# Altium footprint library Pcb-hionyPcbLib.PcbLib: 580 footprints (part 3 of 37)
Each footprint in its own frame and in the unit in brackets; x right, y up, seen from the top. Pads: shape width x height; smd on the part's side, far side on the other; paste and mask are expansions set on the pad; w line width, h text height; cw(c..) or ccw(c..) is an arc to the next point about the centre after c.
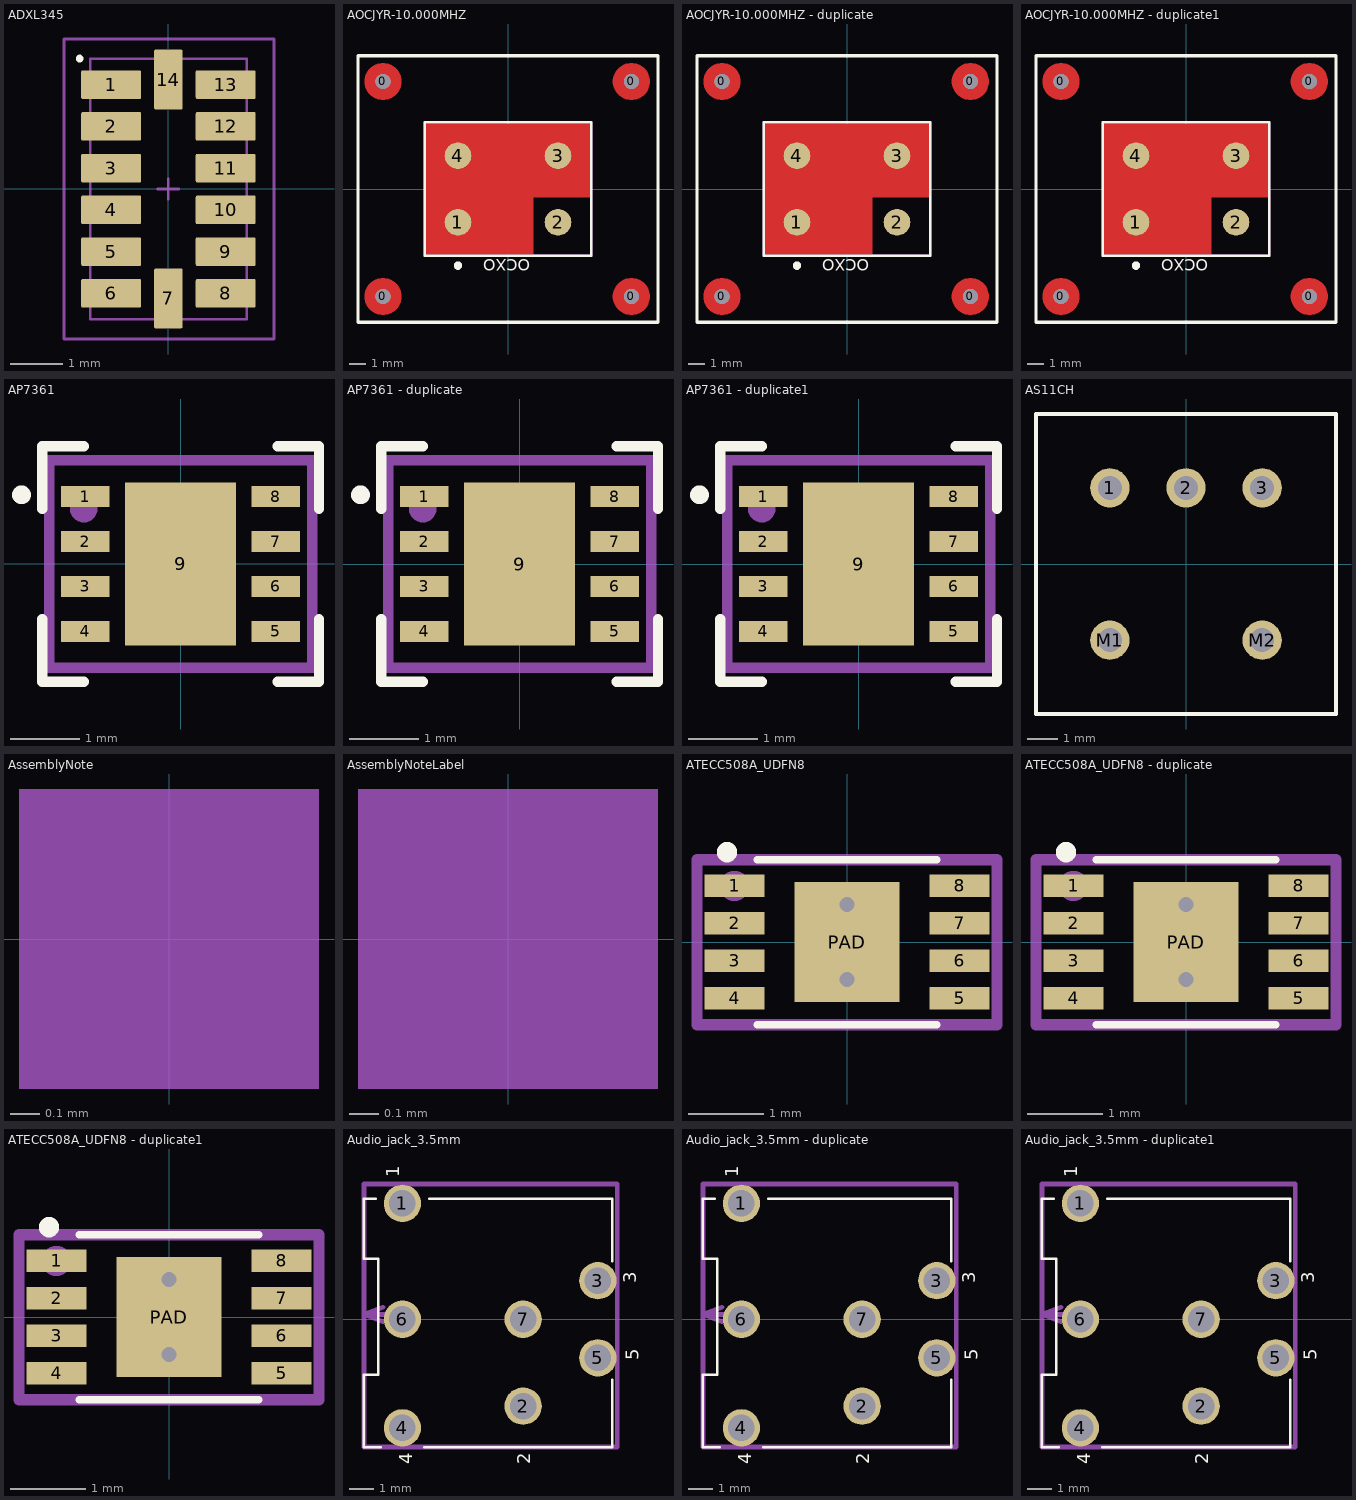
[diagram p2: the footprints below, top view; thin cyan lines are the x and y axes]

## ADXL345 [mm]
pads (14):
  rrect10% 1.145x0.55 smd mask+0.05: 1(-1.097,2) 2(-1.097,1.2) 3(-1.098,0.4) 4(-1.098,-0.4) 5(-1.097,-1.2) 6(-1.097,-2) 8(1.097,-2) 9(1.097,-1.2) 10(1.098,-0.4) 11(1.097,0.4) 12(1.098,1.2) 13(1.097,2)
  rrect10% 0.55x1.145 smd mask+0.05: 7(0,-2.098) 14(0,2.098)
Top Overlay:
  circle w0.127: c-1.7,2.5 r0.01
Mechanical 11:
  text ".Designator" at 0.292,-0.8 h0.5
Mechanical 13:
  lines w0.05: -1.5,-2.5 -1.5,2.5 1.5,2.5 1.5,-2.5 -1.5,-2.5
Mechanical 15:
  lines w0.05: -0.2,0 0.2,0 ; 0,-0.2 0,0.2 ; -2,-2.875 -2,2.875 2.025,2.875 2.025,-2.875 -2,-2.875
3D body "User Library-ADXL345.step": height 1.01, standoff 0.01, extent -1.5,-2.5 1.5,2.5

## AOCJYR-10.000MHZ [mm]
pads (8):
  round 0.9 hole 0.9 unplated: 0(-7.5,6.45) 0(-7.5,-6.45) 0(7.4,-6.45) 0(7.4,6.45)
  round 1.6 smd mask+0.05: 1(-3,-2) 2(3,-2) 3(3,2) 4(-3,2)
Top Layer:
  pour cut-out: 4.9,-0.5 4.9,3.9 -4.9,3.9 -4.9,-3.9 1.525,-3.9 1.525,-0.5
  pour cut-out: 7.4,6.45 7.4,7.55 7.508,7.55 7.721,7.508 7.921,7.425 8.101,7.304 8.254,7.151 8.375,6.971 8.458,6.771 8.5,6.558 8.5,6.45
  pour cut-out: 7.4,6.45 7.4,5.35 7.292,5.35 7.079,5.392 6.879,5.475 6.699,5.596 6.546,5.749 6.425,5.929 6.342,6.129 6.3,6.342 6.3,6.45
  pour cut-out: 7.4,6.45 6.3,6.45 6.3,6.558 6.342,6.771 6.425,6.971 6.546,7.151 6.699,7.304 6.879,7.425 7.079,7.508 7.292,7.55 7.4,7.55
  pour cut-out: 7.4,6.45 8.5,6.45 8.5,6.342 8.458,6.129 8.375,5.929 8.254,5.749 8.101,5.596 7.921,5.475 7.721,5.392 7.508,5.35 7.4,5.35
  pour cut-out: -7.5,6.45 -7.5,7.55 -7.392,7.55 -7.179,7.508 -6.979,7.425 -6.799,7.304 -6.646,7.151 -6.525,6.971 -6.442,6.771 -6.4,6.558 -6.4,6.45
  pour cut-out: -7.5,6.45 -7.5,5.35 -7.608,5.35 -7.821,5.392 -8.021,5.475 -8.201,5.596 -8.354,5.749 -8.475,5.929 -8.558,6.129 -8.6,6.342 -8.6,6.45
  pour cut-out: -7.5,6.45 -8.6,6.45 -8.6,6.558 -8.558,6.771 -8.475,6.971 -8.354,7.151 -8.201,7.304 -8.021,7.425 -7.821,7.508 -7.608,7.55 -7.5,7.55
  pour cut-out: -7.5,6.45 -6.4,6.45 -6.4,6.342 -6.442,6.129 -6.525,5.929 -6.646,5.749 -6.799,5.596 -6.979,5.475 -7.179,5.392 -7.392,5.35 -7.5,5.35
  pour cut-out: -7.5,-6.45 -7.5,-5.35 -7.392,-5.35 -7.179,-5.392 -6.979,-5.475 -6.799,-5.596 -6.646,-5.749 -6.525,-5.929 -6.442,-6.129 -6.4,-6.342 -6.4,-6.45
  pour cut-out: -7.5,-6.45 -7.5,-7.55 -7.608,-7.55 -7.821,-7.508 -8.021,-7.425 -8.201,-7.304 -8.354,-7.151 -8.475,-6.971 -8.558,-6.771 -8.6,-6.558 -8.6,-6.45
  pour cut-out: -7.5,-6.45 -8.6,-6.45 -8.6,-6.342 -8.558,-6.129 -8.475,-5.929 -8.354,-5.749 -8.201,-5.596 -8.021,-5.475 -7.821,-5.392 -7.608,-5.35 -7.5,-5.35
  pour cut-out: -7.5,-6.45 -6.4,-6.45 -6.4,-6.558 -6.442,-6.771 -6.525,-6.971 -6.646,-7.151 -6.799,-7.304 -6.979,-7.425 -7.179,-7.508 -7.392,-7.55 -7.5,-7.55
  pour cut-out: 7.4,-6.45 8.5,-6.45 8.5,-6.558 8.458,-6.771 8.375,-6.971 8.254,-7.151 8.101,-7.304 7.921,-7.425 7.721,-7.508 7.508,-7.55 7.4,-7.55
  pour cut-out: 7.4,-6.45 6.3,-6.45 6.3,-6.342 6.342,-6.129 6.425,-5.929 6.546,-5.749 6.699,-5.596 6.879,-5.475 7.079,-5.392 7.292,-5.35 7.4,-5.35
  pour cut-out: 7.4,-6.45 7.4,-7.55 7.292,-7.55 7.079,-7.508 6.879,-7.425 6.699,-7.304 6.546,-7.151 6.425,-6.971 6.342,-6.771 6.3,-6.558 6.3,-6.45
  pour cut-out: 7.4,-6.45 7.4,-5.35 7.508,-5.35 7.721,-5.392 7.921,-5.475 8.101,-5.596 8.254,-5.749 8.375,-5.929 8.458,-6.129 8.5,-6.342 8.5,-6.45
Top Overlay:
  circle w0.3: c-3,-4.6 r0.1
  lines w0.15: -5,-4 5,-4 5,4 -5,4 -5,-4
  lines w0.2: -9,-8 -9,8 9,8 9,-8 -9,-8
  text "OCXO" at 1.325,-4.225 h0.7
Top Solder:
  drawing of 16 lines, arcs and shapes, not listed
Mechanical 15:
  circle w0.3: c-3,-2 r0.141
  lines w0.15: -1.25,0 1.25,0 ; 0,-1.25 0,1.25 ; -5,-4 -5,4 5,4 5,-4 -5,-4
  text ".Designator" at 2.225,-0.575 h0.55
3D body: height 4.1, standoff 0, extent -4.85,-3.75 4.85,3.75
3D body: height 4.2, standoff 4.1, extent -3.492,-2.498 -2.496,-1.5
3D body: height 0.4, standoff 0, extent -4.9,-3 -4.75,3
3D body: height 0.4, standoff 0, extent 4.75,-3 4.9,3

## AOCJYR-10.000MHZ - duplicate [mm]
pads (8):
  round 0.9 hole 0.9 unplated: 0(-7.5,6.45) 0(-7.5,-6.45) 0(7.4,-6.45) 0(7.4,6.45)
  round 1.6 smd mask+0.05: 1(-3,-2) 2(3,-2) 3(3,2) 4(-3,2)
Top Layer:
  pour cut-out: 7.4,6.45 7.4,7.55 7.508,7.55 7.721,7.508 7.921,7.425 8.101,7.304 8.254,7.151 8.375,6.971 8.458,6.771 8.5,6.558 8.5,6.45
  pour cut-out: 7.4,6.45 7.4,5.35 7.292,5.35 7.079,5.392 6.879,5.475 6.699,5.596 6.546,5.749 6.425,5.929 6.342,6.129 6.3,6.342 6.3,6.45
  pour cut-out: 7.4,6.45 6.3,6.45 6.3,6.558 6.342,6.771 6.425,6.971 6.546,7.151 6.699,7.304 6.879,7.425 7.079,7.508 7.292,7.55 7.4,7.55
  pour cut-out: 7.4,6.45 8.5,6.45 8.5,6.342 8.458,6.129 8.375,5.929 8.254,5.749 8.101,5.596 7.921,5.475 7.721,5.392 7.508,5.35 7.4,5.35
  pour cut-out: -7.5,6.45 -7.5,7.55 -7.392,7.55 -7.179,7.508 -6.979,7.425 -6.799,7.304 -6.646,7.151 -6.525,6.971 -6.442,6.771 -6.4,6.558 -6.4,6.45
  pour cut-out: -7.5,6.45 -7.5,5.35 -7.608,5.35 -7.821,5.392 -8.021,5.475 -8.201,5.596 -8.354,5.749 -8.475,5.929 -8.558,6.129 -8.6,6.342 -8.6,6.45
  pour cut-out: -7.5,6.45 -8.6,6.45 -8.6,6.558 -8.558,6.771 -8.475,6.971 -8.354,7.151 -8.201,7.304 -8.021,7.425 -7.821,7.508 -7.608,7.55 -7.5,7.55
  pour cut-out: -7.5,6.45 -6.4,6.45 -6.4,6.342 -6.442,6.129 -6.525,5.929 -6.646,5.749 -6.799,5.596 -6.979,5.475 -7.179,5.392 -7.392,5.35 -7.5,5.35
  pour cut-out: -7.5,-6.45 -7.5,-5.35 -7.392,-5.35 -7.179,-5.392 -6.979,-5.475 -6.799,-5.596 -6.646,-5.749 -6.525,-5.929 -6.442,-6.129 -6.4,-6.342 -6.4,-6.45
  pour cut-out: -7.5,-6.45 -7.5,-7.55 -7.608,-7.55 -7.821,-7.508 -8.021,-7.425 -8.201,-7.304 -8.354,-7.151 -8.475,-6.971 -8.558,-6.771 -8.6,-6.558 -8.6,-6.45
  pour cut-out: -7.5,-6.45 -8.6,-6.45 -8.6,-6.342 -8.558,-6.129 -8.475,-5.929 -8.354,-5.749 -8.201,-5.596 -8.021,-5.475 -7.821,-5.392 -7.608,-5.35 -7.5,-5.35
  pour cut-out: -7.5,-6.45 -6.4,-6.45 -6.4,-6.558 -6.442,-6.771 -6.525,-6.971 -6.646,-7.151 -6.799,-7.304 -6.979,-7.425 -7.179,-7.508 -7.392,-7.55 -7.5,-7.55
  pour cut-out: 7.4,-6.45 8.5,-6.45 8.5,-6.558 8.458,-6.771 8.375,-6.971 8.254,-7.151 8.101,-7.304 7.921,-7.425 7.721,-7.508 7.508,-7.55 7.4,-7.55
  pour cut-out: 7.4,-6.45 6.3,-6.45 6.3,-6.342 6.342,-6.129 6.425,-5.929 6.546,-5.749 6.699,-5.596 6.879,-5.475 7.079,-5.392 7.292,-5.35 7.4,-5.35
  pour cut-out: 7.4,-6.45 7.4,-7.55 7.292,-7.55 7.079,-7.508 6.879,-7.425 6.699,-7.304 6.546,-7.151 6.425,-6.971 6.342,-6.771 6.3,-6.558 6.3,-6.45
  pour cut-out: 7.4,-6.45 7.4,-5.35 7.508,-5.35 7.721,-5.392 7.921,-5.475 8.101,-5.596 8.254,-5.749 8.375,-5.929 8.458,-6.129 8.5,-6.342 8.5,-6.45
  pour cut-out: 4.9,-0.5 4.9,3.9 -4.9,3.9 -4.9,-3.9 1.525,-3.9 1.525,-0.5
Top Overlay:
  circle w0.3: c-3,-4.6 r0.1
  lines w0.15: -5,-4 5,-4 5,4 -5,4 -5,-4
  lines w0.2: -9,-8 -9,8 9,8 9,-8 -9,-8
  text "OCXO" at 1.325,-4.225 h0.7
Top Solder:
  drawing of 16 lines, arcs and shapes, not listed
Mechanical 15:
  circle w0.3: c-3,-2 r0.141
  lines w0.15: -1.25,0 1.25,0 ; 0,-1.25 0,1.25 ; -5,-4 -5,4 5,4 5,-4 -5,-4
  text ".Designator" at 2.225,-0.575 h0.55
3D body: height 4.1, standoff 0, extent -4.85,-3.75 4.85,3.75
3D body: height 4.2, standoff 4.1, extent -3.492,-2.498 -2.496,-1.5
3D body: height 0.4, standoff 0, extent -4.9,-3 -4.75,3
3D body: height 0.4, standoff 0, extent 4.75,-3 4.9,3

## AOCJYR-10.000MHZ - duplicate1 [mm]
pads (8):
  round 0.9 hole 0.9 unplated: 0(-7.5,6.45) 0(-7.5,-6.45) 0(7.4,-6.45) 0(7.4,6.45)
  round 1.6 smd mask+0.05: 1(-3,-2) 2(3,-2) 3(3,2) 4(-3,2)
Top Layer:
  pour cut-out: 7.4,6.45 7.4,7.55 7.508,7.55 7.721,7.508 7.921,7.425 8.101,7.304 8.254,7.151 8.375,6.971 8.458,6.771 8.5,6.558 8.5,6.45
  pour cut-out: 7.4,6.45 7.4,5.35 7.292,5.35 7.079,5.392 6.879,5.475 6.699,5.596 6.546,5.749 6.425,5.929 6.342,6.129 6.3,6.342 6.3,6.45
  pour cut-out: 7.4,6.45 6.3,6.45 6.3,6.558 6.342,6.771 6.425,6.971 6.546,7.151 6.699,7.304 6.879,7.425 7.079,7.508 7.292,7.55 7.4,7.55
  pour cut-out: 7.4,6.45 8.5,6.45 8.5,6.342 8.458,6.129 8.375,5.929 8.254,5.749 8.101,5.596 7.921,5.475 7.721,5.392 7.508,5.35 7.4,5.35
  pour cut-out: -7.5,6.45 -7.5,7.55 -7.392,7.55 -7.179,7.508 -6.979,7.425 -6.799,7.304 -6.646,7.151 -6.525,6.971 -6.442,6.771 -6.4,6.558 -6.4,6.45
  pour cut-out: -7.5,6.45 -7.5,5.35 -7.608,5.35 -7.821,5.392 -8.021,5.475 -8.201,5.596 -8.354,5.749 -8.475,5.929 -8.558,6.129 -8.6,6.342 -8.6,6.45
  pour cut-out: -7.5,6.45 -8.6,6.45 -8.6,6.558 -8.558,6.771 -8.475,6.971 -8.354,7.151 -8.201,7.304 -8.021,7.425 -7.821,7.508 -7.608,7.55 -7.5,7.55
  pour cut-out: -7.5,6.45 -6.4,6.45 -6.4,6.342 -6.442,6.129 -6.525,5.929 -6.646,5.749 -6.799,5.596 -6.979,5.475 -7.179,5.392 -7.392,5.35 -7.5,5.35
  pour cut-out: -7.5,-6.45 -7.5,-5.35 -7.392,-5.35 -7.179,-5.392 -6.979,-5.475 -6.799,-5.596 -6.646,-5.749 -6.525,-5.929 -6.442,-6.129 -6.4,-6.342 -6.4,-6.45
  pour cut-out: -7.5,-6.45 -7.5,-7.55 -7.608,-7.55 -7.821,-7.508 -8.021,-7.425 -8.201,-7.304 -8.354,-7.151 -8.475,-6.971 -8.558,-6.771 -8.6,-6.558 -8.6,-6.45
  pour cut-out: -7.5,-6.45 -8.6,-6.45 -8.6,-6.342 -8.558,-6.129 -8.475,-5.929 -8.354,-5.749 -8.201,-5.596 -8.021,-5.475 -7.821,-5.392 -7.608,-5.35 -7.5,-5.35
  pour cut-out: -7.5,-6.45 -6.4,-6.45 -6.4,-6.558 -6.442,-6.771 -6.525,-6.971 -6.646,-7.151 -6.799,-7.304 -6.979,-7.425 -7.179,-7.508 -7.392,-7.55 -7.5,-7.55
  pour cut-out: 7.4,-6.45 8.5,-6.45 8.5,-6.558 8.458,-6.771 8.375,-6.971 8.254,-7.151 8.101,-7.304 7.921,-7.425 7.721,-7.508 7.508,-7.55 7.4,-7.55
  pour cut-out: 7.4,-6.45 6.3,-6.45 6.3,-6.342 6.342,-6.129 6.425,-5.929 6.546,-5.749 6.699,-5.596 6.879,-5.475 7.079,-5.392 7.292,-5.35 7.4,-5.35
  pour cut-out: 7.4,-6.45 7.4,-7.55 7.292,-7.55 7.079,-7.508 6.879,-7.425 6.699,-7.304 6.546,-7.151 6.425,-6.971 6.342,-6.771 6.3,-6.558 6.3,-6.45
  pour cut-out: 7.4,-6.45 7.4,-5.35 7.508,-5.35 7.721,-5.392 7.921,-5.475 8.101,-5.596 8.254,-5.749 8.375,-5.929 8.458,-6.129 8.5,-6.342 8.5,-6.45
  pour cut-out: 4.9,-0.5 4.9,3.9 -4.9,3.9 -4.9,-3.9 1.525,-3.9 1.525,-0.5
Top Overlay:
  circle w0.3: c-3,-4.6 r0.1
  lines w0.15: -5,-4 5,-4 5,4 -5,4 -5,-4
  lines w0.2: -9,-8 -9,8 9,8 9,-8 -9,-8
  text "OCXO" at 1.325,-4.225 h0.7
Top Solder:
  drawing of 16 lines, arcs and shapes, not listed
Mechanical 15:
  circle w0.3: c-3,-2 r0.141
  lines w0.15: -1.25,0 1.25,0 ; 0,-1.25 0,1.25 ; -5,-4 -5,4 5,4 5,-4 -5,-4
  text ".Designator" at 2.225,-0.575 h0.55
3D body: height 4.1, standoff 0, extent -4.85,-3.75 4.85,3.75
3D body: height 4.2, standoff 4.1, extent -3.492,-2.498 -2.496,-1.5
3D body: height 0.4, standoff 0, extent -4.9,-3 -4.75,3
3D body: height 0.4, standoff 0, extent 4.75,-3 4.9,3

## AP7361 [mm]
pads (9):
  rect 0.7x0.3 smd mask+0.05: 1(-1.375,0.975) 2(-1.375,0.325) 3(-1.375,-0.325) 4(-1.375,-0.975) 5(1.375,-0.975) 6(1.375,-0.325) 7(1.375,0.325) 8(1.375,0.975)
  rect 1.6x2.35 smd mask+0.05: 9(0,0)
Top Overlay:
  circle w0.2: c-2.3,1 r0.035
  lines w0.15: -2,-0.8 -2,-1.7 -1.4,-1.7 ; -2,0.8 -2,1.7 -1.4,1.7 ; 1.4,-1.7 2,-1.7 2,-0.8 ; 1.4,1.7 2,1.7 2,0.8
Mechanical 15:
  circle w0.2: c-1.4,0.8 r0.1
  lines w0.15: -0.4,0 0,0 ; 0,-0.4 0,0 ; 0,0.4 0,0 ; 0.4,0 0,0 ; -1.9,-1.5 1.9,-1.5 1.9,1.5 -1.9,1.5 -1.9,-1.5
  text ".Designator" at 0.93,1.214 h0.55
3D body "User Library-DFN8_3x3mm__65mm.step": height 0.8, standoff 0, extent -1.52,-1.5 1.5,1.5

## AP7361 - duplicate [mm]
pads (9):
  rect 0.7x0.3 smd mask+0.05: 1(-1.375,0.975) 2(-1.375,0.325) 3(-1.375,-0.325) 4(-1.375,-0.975) 5(1.375,-0.975) 6(1.375,-0.325) 7(1.375,0.325) 8(1.375,0.975)
  rect 1.6x2.35 smd mask+0.05: 9(0,0)
Top Overlay:
  circle w0.2: c-2.3,1 r0.035
  lines w0.15: -2,-0.8 -2,-1.7 -1.4,-1.7 ; -2,0.8 -2,1.7 -1.4,1.7 ; 1.4,-1.7 2,-1.7 2,-0.8 ; 1.4,1.7 2,1.7 2,0.8
Mechanical 15:
  circle w0.2: c-1.4,0.8 r0.1
  lines w0.15: -0.4,0 0,0 ; 0,-0.4 0,0 ; 0,0.4 0,0 ; 0.4,0 0,0 ; -1.9,-1.5 1.9,-1.5 1.9,1.5 -1.9,1.5 -1.9,-1.5
  text ".Designator" at 1.025,-1.907 h0.55
3D body "User Library-DFN8_3x3mm__65mm.step": height 0.8, standoff 0, extent -1.52,-1.5 1.5,1.5

## AP7361 - duplicate1 [mm]
pads (9):
  rect 0.7x0.3 smd mask+0.05: 1(-1.375,0.975) 2(-1.375,0.325) 3(-1.375,-0.325) 4(-1.375,-0.975) 5(1.375,-0.975) 6(1.375,-0.325) 7(1.375,0.325) 8(1.375,0.975)
  rect 1.6x2.35 smd mask+0.05: 9(0,0)
Top Overlay:
  circle w0.2: c-2.3,1 r0.035
  lines w0.15: -2,-0.8 -2,-1.7 -1.4,-1.7 ; -2,0.8 -2,1.7 -1.4,1.7 ; 1.4,-1.7 2,-1.7 2,-0.8 ; 1.4,1.7 2,1.7 2,0.8
Mechanical 15:
  circle w0.2: c-1.4,0.8 r0.1
  lines w0.15: -0.4,0 0,0 ; 0,-0.4 0,0 ; 0,0.4 0,0 ; 0.4,0 0,0 ; -1.9,-1.5 1.9,-1.5 1.9,1.5 -1.9,1.5 -1.9,-1.5
  text ".Designator" at 1.025,-1.907 h0.55
3D body "User Library-DFN8_3x3mm__65mm.step": height 0.8, standoff 0, extent -1.52,-1.5 1.5,1.5

## AS11CH [mm]
pads (5):
  round 1.308 hole 0.8: 1(-2.54,2.54) 2(0,2.54) 3(2.54,2.54) M1(-2.54,-2.54) M2(2.54,-2.54)
Top Overlay:
  lines w0.127: -5,-5 -5,5 5,5 5,-5 -5,-5
3D body "AS11CH--3DModel-STEP-56544.STEP": height 6.18, standoff -3.1, extent -4.953,-11.079 4.847,2.921

## AssemblyNote [mm]
Top 3D Body:
  rectangle: -0.508,-0.508 0.508,0.508
  text ".Comment" at 1.143,-0.508 h1.02
  text ".Designator" at -4.191,-0.508 h1.02

## AssemblyNoteLabel [mm]
Top 3D Body:
  rectangle: -0.508,-0.508 0.508,0.508
  text ".Designator" at -4.191,-0.508 h1.02
  text "Install label in silkscreened box after final wash.  Text shall be 8 pt font.  Text shall be per the Label Table in the PDF schematic." at 1.143,-0.508 h1.02

## ATECC508A_UDFN8 [mm]
pads (9):
  rect 0.8x0.3 smd mask+0.05: 1(-1.5,0.75) 2(-1.5,0.25) 3(-1.5,-0.25) 4(-1.5,-0.75) 5(1.5,-0.75) 6(1.5,-0.25) 7(1.5,0.25) 8(1.5,0.75)
  rect 1.4x1.6 smd mask+0.05: PAD(0,0)
via 0,-0.5 diameter 0.4 hole 0.2
via 0,0.5 diameter 0.4 hole 0.2
Top Overlay:
  circle w0.2: c-1.6,1.2 r0.035
  lines w0.1: -1.2,-1.1 1.2,-1.1 ; -1.2,1.1 1.2,1.1
Mechanical 15:
  circle w0.3: c-1.5,0.75 r0.05
  lines w0.15: -0.3,0 0.3,0 ; 0,-0.3 0,0.3 ; -2,-1.1 -2,1.1 2,1.1 2,-1.1 -2,-1.1
  text ".Designator" at -1.3,-0.9 h0.55
3D body "User Library-UDFN-8_2X3_0,5.step": height 0.53, standoff 0, extent -1.5,-1 1.5,1

## ATECC508A_UDFN8 - duplicate [mm]
pads (9):
  rect 0.8x0.3 smd mask+0.05: 1(-1.5,0.75) 2(-1.5,0.25) 3(-1.5,-0.25) 4(-1.5,-0.75) 5(1.5,-0.75) 6(1.5,-0.25) 7(1.5,0.25) 8(1.5,0.75)
  rect 1.4x1.6 smd mask+0.05: PAD(0,0)
via 0,-0.5 diameter 0.4 hole 0.2
via 0,0.5 diameter 0.4 hole 0.2
Top Overlay:
  circle w0.2: c-1.6,1.2 r0.035
  lines w0.1: -1.2,-1.1 1.2,-1.1 ; -1.2,1.1 1.2,1.1
Mechanical 15:
  circle w0.3: c-1.5,0.75 r0.05
  lines w0.15: -0.3,0 0.3,0 ; 0,-0.3 0,0.3 ; -2,-1.1 -2,1.1 2,1.1 2,-1.1 -2,-1.1
  text ".Designator" at -1.3,-0.9 h0.55
3D body "User Library-UDFN-8_2X3_0,5.step": height 0.53, standoff 0, extent -1.5,-1 1.5,1

## ATECC508A_UDFN8 - duplicate1 [mm]
pads (9):
  rect 0.8x0.3 smd mask+0.05: 1(-1.5,0.75) 2(-1.5,0.25) 3(-1.5,-0.25) 4(-1.5,-0.75) 5(1.5,-0.75) 6(1.5,-0.25) 7(1.5,0.25) 8(1.5,0.75)
  rect 1.4x1.6 smd mask+0.05: PAD(0,0)
via 0,0.5 diameter 0.4 hole 0.2
via 0,-0.5 diameter 0.4 hole 0.2
Top Overlay:
  circle w0.2: c-1.6,1.2 r0.035
  lines w0.1: -1.2,-1.1 1.2,-1.1 ; -1.2,1.1 1.2,1.1
Mechanical 15:
  circle w0.3: c-1.5,0.75 r0.05
  lines w0.15: -0.3,0 0.3,0 ; 0,-0.3 0,0.3 ; -2,-1.1 2,-1.1 2,1.1 -2,1.1 -2,-1.1
  text ".Designator" at -1.3,-0.9 h0.55
3D body "User Library-UDFN-8_2X3_0,5.step": height 0.53, standoff 0, extent -1.5,-1 1.5,1

## Audio_jack_3.5mm [mm]
pads (7):
  round 1.55 hole 1.1 mask+0.05: 1(2.9,4.8) 2(7.9,-3.6) 3(11,1.6) 4(2.9,-4.5) 5(11,-1.6) 6(2.9,0) 7(7.9,0)
Top Overlay:
  lines w0.1: 1.8,5 1.3,5 1.3,2.5 1.9,2.5 1.9,-2.3 1.3,-2.3 1.3,-5.3 2,-5.3 ; 3.8,-5.3 11.6,-5.3 11.6,-2.5 ; 4,5 11.6,5 11.6,2.4
  text "5" at 12.7,-1.7 h0.55
  text "4" at 3.3,-6 h0.55
  text "3" at 12.6,1.5 h0.55
  text "2" at 8.2,-6 h0.55
  text "1" at 2.775,5.885 h0.55
Mechanical 15:
  lines w0.2: 2.1,-0.1 1.3,0.2 ; 2.1,0.5 1.3,0.2 ; 2.8,0.2 1.3,0.2 ; 1.3,-5.3 1.3,5.6 11.8,5.6 11.8,-5.3 1.3,-5.3
  text "1" at 3.2,3.5 h0.55
  text "2" at 6.8,-3.8 h0.55
  text "3" at 9.9,1.5 h0.55
  text "4" at 3.2,-3.4 h0.55
  text "5" at 9.9,-1.7 h0.55
  text ".Designator" at 6.925,-0.615 h0.55
  text "Board edge" at 3.6,-2.7 h0.55
3D body "SJ-43514.stp": height 5.2, standoff -2.05, extent -2.5,-5.3 11.5,4.9

## Audio_jack_3.5mm - duplicate [mm]
pads (7):
  round 1.55 hole 1.1 mask+0.05: 1(2.9,4.8) 2(7.9,-3.6) 3(11,1.6) 4(2.9,-4.5) 5(11,-1.6) 6(2.9,0) 7(7.9,0)
Top Overlay:
  lines w0.1: 1.8,5 1.3,5 1.3,2.5 1.9,2.5 1.9,-2.3 1.3,-2.3 1.3,-5.3 2,-5.3 ; 3.8,-5.3 11.6,-5.3 11.6,-2.5 ; 4,5 11.6,5 11.6,2.4
  text "1" at 2.775,5.885 h0.55
  text "2" at 8.2,-6 h0.55
  text "3" at 12.6,1.5 h0.55
  text "4" at 3.3,-6 h0.55
  text "5" at 12.7,-1.7 h0.55
Mechanical 15:
  lines w0.2: 2.1,-0.1 1.3,0.2 ; 2.1,0.5 1.3,0.2 ; 2.8,0.2 1.3,0.2 ; 1.3,-5.3 11.8,-5.3 11.8,5.6 1.3,5.6 1.3,-5.3
  text "Board edge" at 3.6,-2.7 h0.55
  text ".Designator" at 6.925,-0.615 h0.55
  text "5" at 9.9,-1.7 h0.55
  text "4" at 3.2,-3.4 h0.55
  text "3" at 9.9,1.5 h0.55
  text "2" at 6.8,-3.8 h0.55
  text "1" at 3.2,3.5 h0.55
3D body "SJ-43514.stp": height 5.2, standoff -2.05, extent -2.5,-5.3 11.5,4.9

## Audio_jack_3.5mm - duplicate1 [mm]
pads (7):
  round 1.55 hole 1.1 mask+0.05: 1(2.9,4.8) 2(7.9,-3.6) 3(11,1.6) 4(2.9,-4.5) 5(11,-1.6) 6(2.9,0) 7(7.9,0)
Top Overlay:
  lines w0.1: 1.8,5 1.3,5 1.3,2.5 1.9,2.5 1.9,-2.3 1.3,-2.3 1.3,-5.3 2,-5.3 ; 3.8,-5.3 11.6,-5.3 11.6,-2.5 ; 4,5 11.6,5 11.6,2.4
  text "1" at 2.775,5.885 h0.55
  text "2" at 8.2,-6 h0.55
  text "3" at 12.6,1.5 h0.55
  text "4" at 3.3,-6 h0.55
  text "5" at 12.7,-1.7 h0.55
Mechanical 15:
  lines w0.2: 2.1,-0.1 1.3,0.2 ; 2.1,0.5 1.3,0.2 ; 2.8,0.2 1.3,0.2 ; 1.3,-5.3 11.8,-5.3 11.8,5.6 1.3,5.6 1.3,-5.3
  text "Board edge" at 3.6,-2.7 h0.55
  text ".Designator" at 6.925,-0.615 h0.55
  text "5" at 9.9,-1.7 h0.55
  text "4" at 3.2,-3.4 h0.55
  text "3" at 9.9,1.5 h0.55
  text "2" at 6.8,-3.8 h0.55
  text "1" at 3.2,3.5 h0.55
3D body "SJ-43514.stp": height 5.2, standoff -2.05, extent -2.5,-5.3 11.5,4.9